# Altium footprint library CMR_Miscellaneous_Devices.PcbLib: 103 footprints (part 3 of 7)
Each footprint in its own frame and in the unit in brackets; x right, y up, seen from the top. Pads: shape width x height; smd on the part's side, far side on the other; paste and mask are expansions set on the pad; w line width, h text height; cw(c..) or ccw(c..) is an arc to the next point about the centre after c.
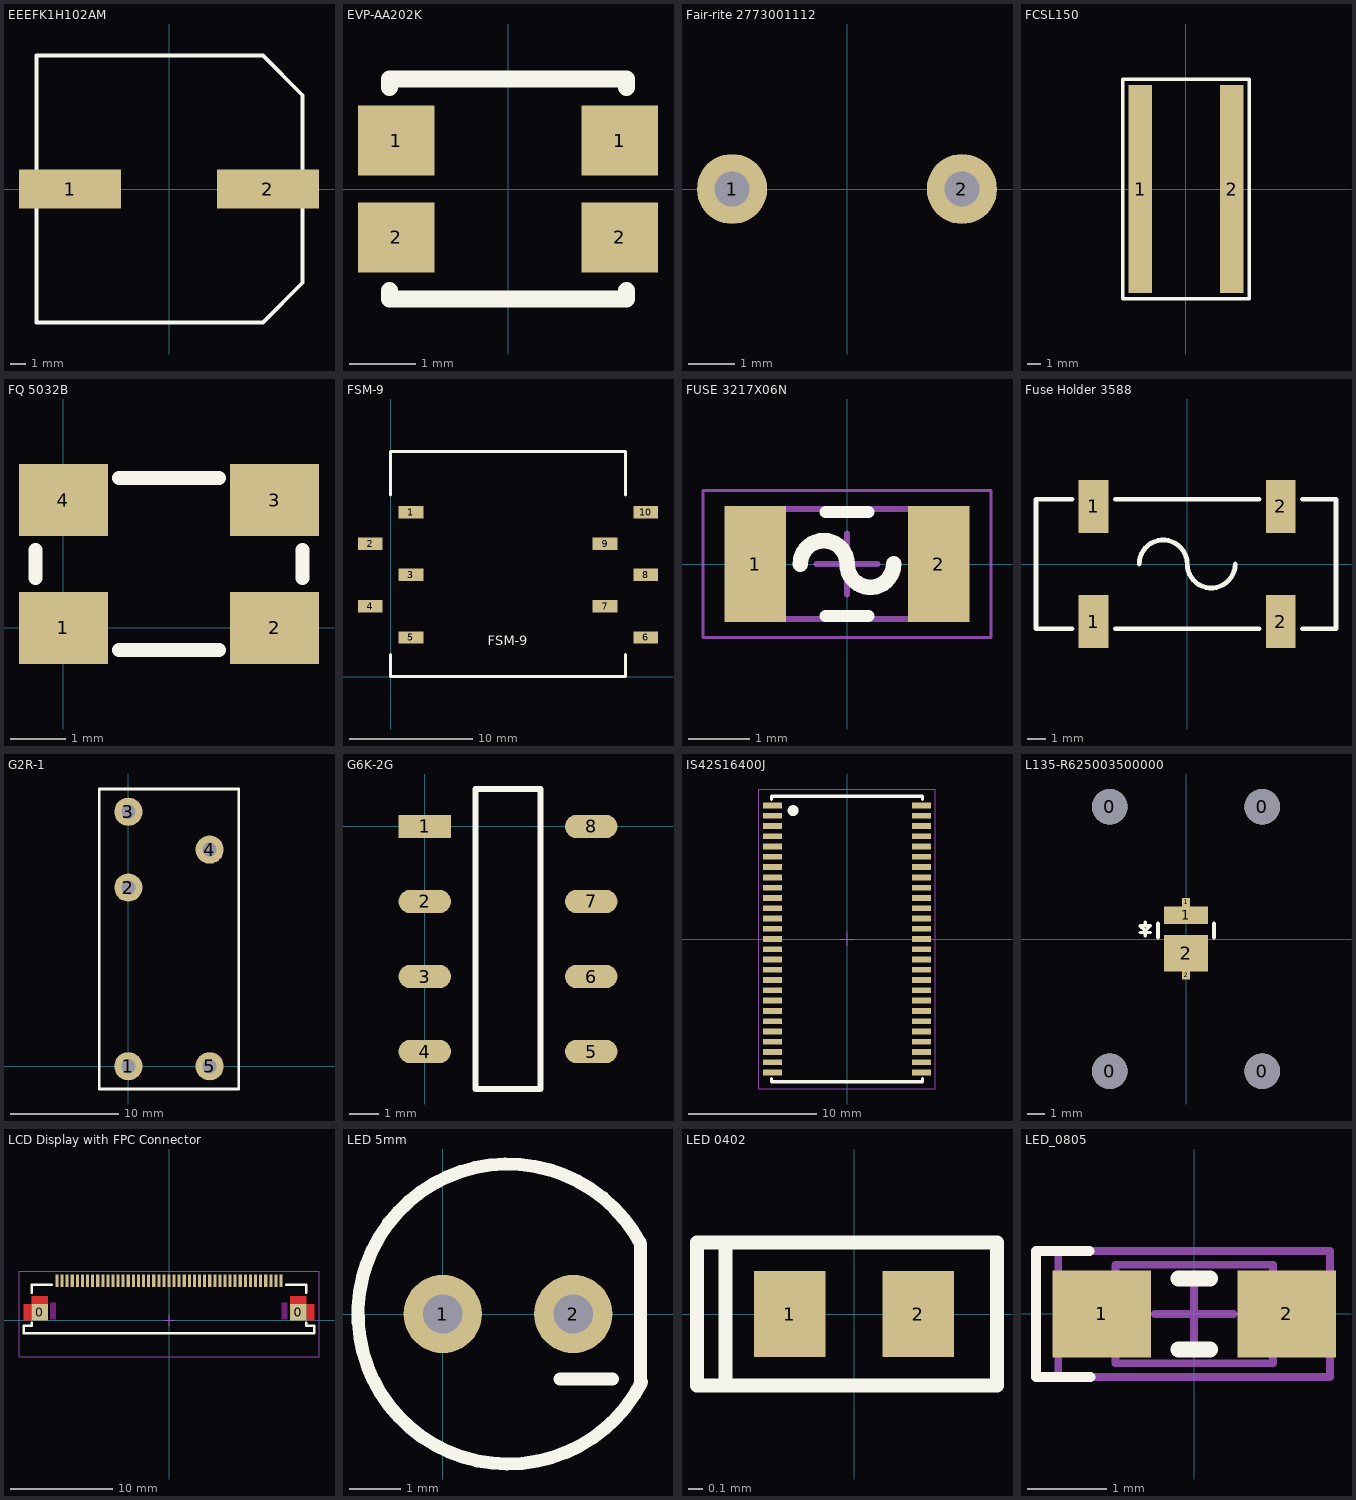
[diagram p2: the footprints below, top view; thin cyan lines are the x and y axes]

## EEEFK1H102AM [mm]
height 16.5
pads (2):
  rect 6.5x2.5 smd: 1(-6.3,0) 2(6.3,0)
Top Overlay:
  lines w0.254: -8.45,-8.5 5.978,-8.5 8.509,-5.969 8.509,0.381 8.509,5.969 5.978,8.5 -8.45,8.5 -8.45,0.195 -8.45,-7.425 -8.45,-8.5
3D body: height 17.27, standoff 0, extent -8.509,-8.506 8.509,8.506
3D body: height 1.78, standoff 0, extent -8.45,-8.5 8.509,8.5

## EVP-AA202K [mm] "Momentary Switch SMT SPST-NO EVP-AA series"
height 1.7
pads (4):
  rect 1.15x1.05 smd: 1(-1.675,0.725) 1(1.675,0.725) 2(-1.675,-0.725) 2(1.675,-0.725)
Top Overlay:
  lines w0.254: -1.778,-1.524 -1.778,-1.651 1.778,-1.651 1.778,-1.524 ; -1.778,1.524 -1.778,1.651 1.778,1.651 1.778,1.524
3D body "EVPAA-002K_202K_402W_602W_802Q.STEP": height 1.7, standoff 0, extent -2.161,-1.546 2.139,1.564

## Fair-rite 2773001112 [mil] "2773001112 Ferrite Bead"
height 137.8
pads (2):
  round 60 hole 30: 1(-98.43,0) 2(98.43,0)
3D body: height 147.55, standoff 9.93, extent -87.6,-68.9 87.6,68.89

## FCSL150 [mm]
pads (2):
  rect 1.7x15.2 smd: 1(-3.35,0) 2(3.35,0)
Top Overlay:
  lines w0.254: -4.6,-8 4.6,-8 4.6,8 -4.6,8 -4.6,-8
3D body: height 0.5, standoff 0, extent -3.8,-7.5 3.8,7.5

## FQ 5032B [mm]
height 1.2
pads (4):
  rect 1.6x1.3 smd: 1(0,0) 2(3.8,0) 3(3.8,2.3) 4(0,2.3)
Top Overlay:
  lines w0.254: -0.5,0.9 -0.5,1.4 ; 1,-0.4 2.8,-0.4 ; 1,2.7 2.8,2.7 ; 4.3,0.9 4.3,1.4

## FSM-9 [mm] "Hillcrest Labs FSM-9 9-axis IMU/AHRS"
pads (10):
  rect 2x1 smd: 1(1.65,13.34) 2(-1.65,10.8) 3(1.65,8.26) 4(-1.65,5.72) 5(1.65,3.18) 6(20.7,3.18) 7(17.4,5.72) 8(20.7,8.26) 9(17.4,10.8) 10(20.7,13.34)
Top Overlay:
  lines w0.254: 0,1.778 0,0 19.05,0 19.05,1.778 ; 0,14.732 0,18.288 19.05,18.288 19.05,14.732
  text "FSM-9" at 7.874,2.54 h0.76
3D body "_ _ _C051KFXC-RC.STEP": height 7.5, standoff 0, extent 16.915,1.905 21.185,14.605
3D body "_ _ _C051KFXC-RC.STEP": height 7.5, standoff 0, extent -2.135,1.905 2.135,14.605
3D body: height 8.75, standoff 0.2, extent 18.796,2.921 19.304,3.429
3D body: height 8.75, standoff 0.2, extent 18.796,5.461 19.304,5.969
3D body: height 8.75, standoff 0.2, extent 18.796,8.001 19.304,8.509
3D body: height 8.75, standoff 0.2, extent 18.796,10.541 19.304,11.049
3D body: height 8.75, standoff 0.2, extent 18.796,13.081 19.304,13.589
3D body "FSM-USB as Part.STEP": height 11.49, standoff 7.54, extent 0.05,0.013 19.05,18.275
3D body: height 8.75, standoff 0.2, extent -0.254,13.081 0.254,13.589
3D body: height 8.75, standoff 0.2, extent -0.254,10.541 0.254,11.049
3D body: height 8.75, standoff 0.2, extent -0.254,8.001 0.254,8.509
3D body: height 8.75, standoff 0.2, extent -0.254,5.461 0.254,5.969
3D body: height 8.75, standoff 0.2, extent -0.254,2.921 0.254,3.429

## FUSE 3217X06N [mm] "PTC Resettable Fuse 8V Ih Surface Mount 1206 (3216 Metric), Concave"
height 0.6
pads (2):
  rect 1x1.9 smd: 1(-1.5,0) 2(1.5,0)
Top Overlay:
  lines w0.2: -0.35,-0.85 0.35,-0.85 ; -0.35,0.85 0.35,0.85
  lines w0.254: -0.763,0 cw(c-0.381,0) 0.001,0 ccw(c0.381,0) 0.761,0
Mechanical 13:
  lines w0.1: -1.75,-0.9 1.75,-0.9 1.75,0.9 -1.75,0.9 -1.75,-0.9
Mechanical 15:
  lines w0.05: -2.35,-1.2 2.35,-1.2 2.35,1.2 -2.35,1.2 -2.35,-1.2
  lines w0.1: -0.5,0 0.5,0 ; 0,-0.5 0,0.5
3D body: height 0.6, standoff 0, extent 1.32,-0.9 1.75,0.9
3D body: height 0.6, standoff 0, extent -1.75,-0.9 -1.32,0.9
3D body: height 0.6, standoff 0, extent -1.32,-0.9 1.32,0.9

## Fuse Holder 3588 [mil] "Keystone Electronics 3588 Automotive Blade Fuse Holder, SMT"
pads (4):
  rect 62x111 smd: 1(-195,-120) 1(-195,120) 2(195,-120) 2(195,120)
Top Overlay:
  lines w10: -240,-135 -315,-135 -315,135 -240,135 ; -150,-135 150,-135 ; -150,135 150,135 ; -100,0 cw(c-50,0) 0,0 ccw(c50,0) 100,0 ; 240,-135 310,-135 310,135 240,135
3D body "keystone-PN3588.STEP": height 310.77, standoff 0.41, extent -316.23,-172.62 313.77,172.11
3D body "Fusibile Lama MINI Type 1.stp": height 686.46, standoff 44.72, extent -214.56,-74.79 214.57,74.81

## G2R-1 [mm] "G2R-1 RELAY GEN PURPOSE SPDT"
height 25.3
pads (5):
  round 2.6 hole 1.3: 1(0,0) 2(0,16.5) 3(0,23.5) 4(7.5,20) 5(7.5,0)
Top Overlay:
  lines w0.254: -2.7,-2.1 10.2,-2.1 10.2,25.6 -2.7,25.6 -2.7,-2.1
3D body: height 25.2, standoff 0.3, extent -2.7,-2.1 10.2,25.6

## G6K-2G [mm]
pads (8):
  rect 1.8x0.8 smd: 1(0,0)
  oval 1.8x0.8 smd: 2(0,-2.57) 3(0,-5.14) 4(0,-7.71) 5(5.7,-7.71) 6(5.7,-5.14) 7(5.7,-2.57) 8(5.7,0)
Top Overlay:
  lines w0.2: 3.492,1.285 3.965,1.285 3.965,-8.995 1.735,-8.995 1.735,1.285 3.7,1.285

## IS42S16400J [mm] "64Mbit SDRAM"
pads (54):
  rect 1.5x0.45 smd: 1(-5.8,10.4) 2(-5.8,9.6) 3(-5.8,8.8) 4(-5.8,8) 5(-5.8,7.2) 6(-5.8,6.4) 7(-5.8,5.6) 8(-5.8,4.8) 9(-5.8,4) 10(-5.8,3.2) 11(-5.8,2.4) 12(-5.8,1.6) 13(-5.8,0.8) 14(-5.8,0) 15(-5.8,-0.8) 16(-5.8,-1.6) 17(-5.8,-2.4) 18(-5.8,-3.2) 19(-5.8,-4) 20(-5.8,-4.8) 21(-5.8,-5.6) 22(-5.8,-6.4) 23(-5.8,-7.2) 24(-5.8,-8) 25(-5.8,-8.8) 26(-5.8,-9.6) 27(-5.8,-10.4) 28(5.8,-10.4) 29(5.8,-9.6) 30(5.8,-8.8) 31(5.8,-8) 32(5.8,-7.2) 33(5.8,-6.4) 34(5.8,-5.6) 35(5.8,-4.8) 36(5.8,-4) 37(5.8,-3.2) 38(5.8,-2.4) 39(5.8,-1.6) 40(5.8,-0.8) 41(5.8,0) 42(5.8,0.8) 43(5.8,1.6) 44(5.8,2.4) 45(5.8,3.2) 46(5.8,4) 47(5.8,4.8) 48(5.8,5.6) 49(5.8,6.4) 50(5.8,7.2) 51(5.8,8) 52(5.8,8.8) 53(5.8,9.6) 54(5.8,10.4)
Top Overlay:
  circle w0.254: c-4.2,10 r0.1
  circle w0.254: c-4.2,10 r0.3
  lines w0.254: -5.875,-10.875 -5.875,-11.125 5.875,-11.125 5.875,-10.875 ; -5.875,10.875 -5.875,11.125 5.875,11.125 5.875,10.875
Mechanical 15:
  lines w0.051: -0.508,0 0.508,0 ; 0,-0.508 0,0.508 ; -6.858,-11.684 -2.54,-11.684 6.858,-11.684 6.858,11.684 0,11.684 -6.858,11.684 -6.858,8.636 -6.858,-11.684
3D body "SW3dPS-TSOP2-54.STEP": height 1.3, standoff -0.4, extent -5.885,-11.11 5.875,11.11

## L135-R625003500000 [mm] "LUXEON 3535L Color Line"
pads (8):
  round 2.1 hole 2.1 unplated: 0(-4.5,-7.8) 0(-4.5,7.8) 0(4.5,-7.8) 0(4.5,7.8)
  rect 2.6x1.02 smd: 1(0,1.4)
  rect 0.5x0.5 smd: 1(0,2.156) 2(0,-2.134)
  rect 2.6x2.13 smd: 2(0,-0.84)
Top Overlay:
  lines w0.2: -2.713,0.381 -2.113,0.381 ; -2.413,0.181 -2.413,0.381 ; -2.413,0.781 -2.413,0.981 ; -2.713,0.781 -2.413,0.481 -2.113,0.781 -2.713,0.781
  lines w0.254: -1.654,0.108 -1.654,0.908 ; 1.654,0.108 1.654,0.908
3D body "PLCC-2 package 3D model.stp": height 1.62, standoff -0.03, extent -1.403,-1.749 1.397,1.749
3D body "10734_Iss1_230409.STEP": height 12.3, standoff -0.8, extent -11.05,-10.951 11.05,11
3D body: height 10.65, standoff 10.6, extent -9.85,-9.847 9.85,9.847

## LCD Display with FPC Connector [mm] "2.8\" Displaytech DT028ATFT LCD Display with Molex 0541044531 Right Angle 45-pin FPC Connector"
pads (47):
  rect 1.6x1.6 smd: 0(-12.7,0.8) 0(12.7,0.8)
  rect 0.3x1.2 smd: 1(-11,3.9) 2(-10.5,3.9) 3(-10,3.9) 4(-9.5,3.9) 5(-9,3.9) 6(-8.5,3.9) 7(-8,3.9) 8(-7.5,3.9) 9(-7,3.9) 10(-6.5,3.9) 11(-6,3.9) 12(-5.5,3.9) 13(-5,3.9) 14(-4.5,3.9) 15(-4,3.9) 16(-3.5,3.9) 17(-3,3.9) 18(-2.5,3.9) 19(-2,3.9) 20(-1.5,3.9) 21(-1,3.9) 22(-0.5,3.9) 23(0,3.9) 24(0.5,3.9) 25(1,3.9) 26(1.5,3.9) 27(2,3.9) 28(2.5,3.9) 29(3,3.9) 30(3.5,3.9) 31(4,3.9) 32(4.5,3.9) 33(5,3.9) 34(5.5,3.9) 35(6,3.9) 36(6.5,3.9) 37(7,3.9) 38(7.5,3.9) 39(8,3.9) 40(8.5,3.9) 41(9,3.9) 42(9.5,3.9) 43(10,3.9) 44(10.5,3.9) 45(11,3.9)
Top Layer:
  rectangle: -14.3,0 -13.5,1.6
  rectangle: -13.5,1.6 -11.9,2.4
  rectangle: 11.9,1.6 13.5,2.4
  rectangle: 13.5,0 14.3,1.6
Top Overlay:
  lines w0.254: -13.5,-0.25 -13.5,-0.5 -14.25,-0.5 -14.25,-1.25 14.25,-1.25 14.25,-0.5 13.5,-0.5 13.5,-0.25 ; -13.5,2.75 -13.5,3.5 -11.5,3.5 ; 11.5,3.5 13.5,3.5 13.5,2.75
Keep-Out Layer:
  region: 11.649,1.778 11.049,1.778 11.049,0.078 11.649,0.078
  rectangle: -11.684,0.078 -11.084,1.778
Mechanical 15:
  lines w0.051: -0.508,0 0.508,0 ; 0,-0.508 0,0.508 ; -14.732,-3.556 14.732,-3.556 14.732,1.27 14.732,4.826 10.16,4.826 -14.732,4.826 -14.732,-3.556
3D body "541044531.stp": height 2.03, standoff -0.02, extent -14,-3.1 14,4.05
3D body "LCD_Real.STEP": height 15, standoff 0.57, extent -24.995,-9.1 24.995,59.25

## LED 5mm [mil]
height 338.58
pads (2):
  round 60 hole 30: 1(0,0) 2(100,0)
Top Overlay:
  lines w10: 90,-50 130,-50 ; 151.73,-51.79 151.73,53.62 ccw(c50,0) 152.48,-52.17
3D body "LED-5mm.STEP": height 338.58, standoff 0, extent -65.14,-114.14 149.43,118.15

## LED 0402 [mm]
pads (2):
  rect 0.5x0.6 smd: 1(-0.45,0) 2(0.45,0)
Top Overlay:
  lines w0.1: -0.9,-0.5 -0.9,0.5 ; -1.1,-0.5 -1.1,0.5 1,0.5 1,-0.5 -1.1,-0.5
3D body: height 0.25, standoff 0, extent -0.6,-0.3 0.6,0.3

## LED_0805 [mm] "Liteon 0805 Chip LED"
pads (2):
  rect 1.25x1.1 smd: 1(-1.175,0) 2(1.175,0)
Top Overlay:
  lines w0.127: -1.325,0.8 -2.007,0.8 -2.007,-0.8 -1.314,-0.8
  lines w0.2: -0.2,-0.45 0.2,-0.45 ; -0.2,0.45 0.2,0.45
Mechanical 13:
  lines w0.1: -1,-0.625 -1,0.625 1,0.625 1,-0.625 -1,-0.625
Mechanical 15:
  lines w0.1: -0.5,0 0.5,0 ; 0,-0.5 0,0.5 ; -1.725,-0.8 -1.725,0.8 1.725,0.8 1.725,-0.8 -1.725,-0.8
3D body: height 0.8, standoff 0, extent -1,-0.625 1,0.625